# Altium footprint library 元件库PCB.PcbLib: 63 footprints (part 1 of 4)
Each footprint in its own frame and in the unit in brackets; x right, y up, seen from the top. Pads: shape width x height; smd on the part's side, far side on the other; paste and mask are expansions set on the pad; w line width, h text height; cw(c..) or ccw(c..) is an arc to the next point about the centre after c.
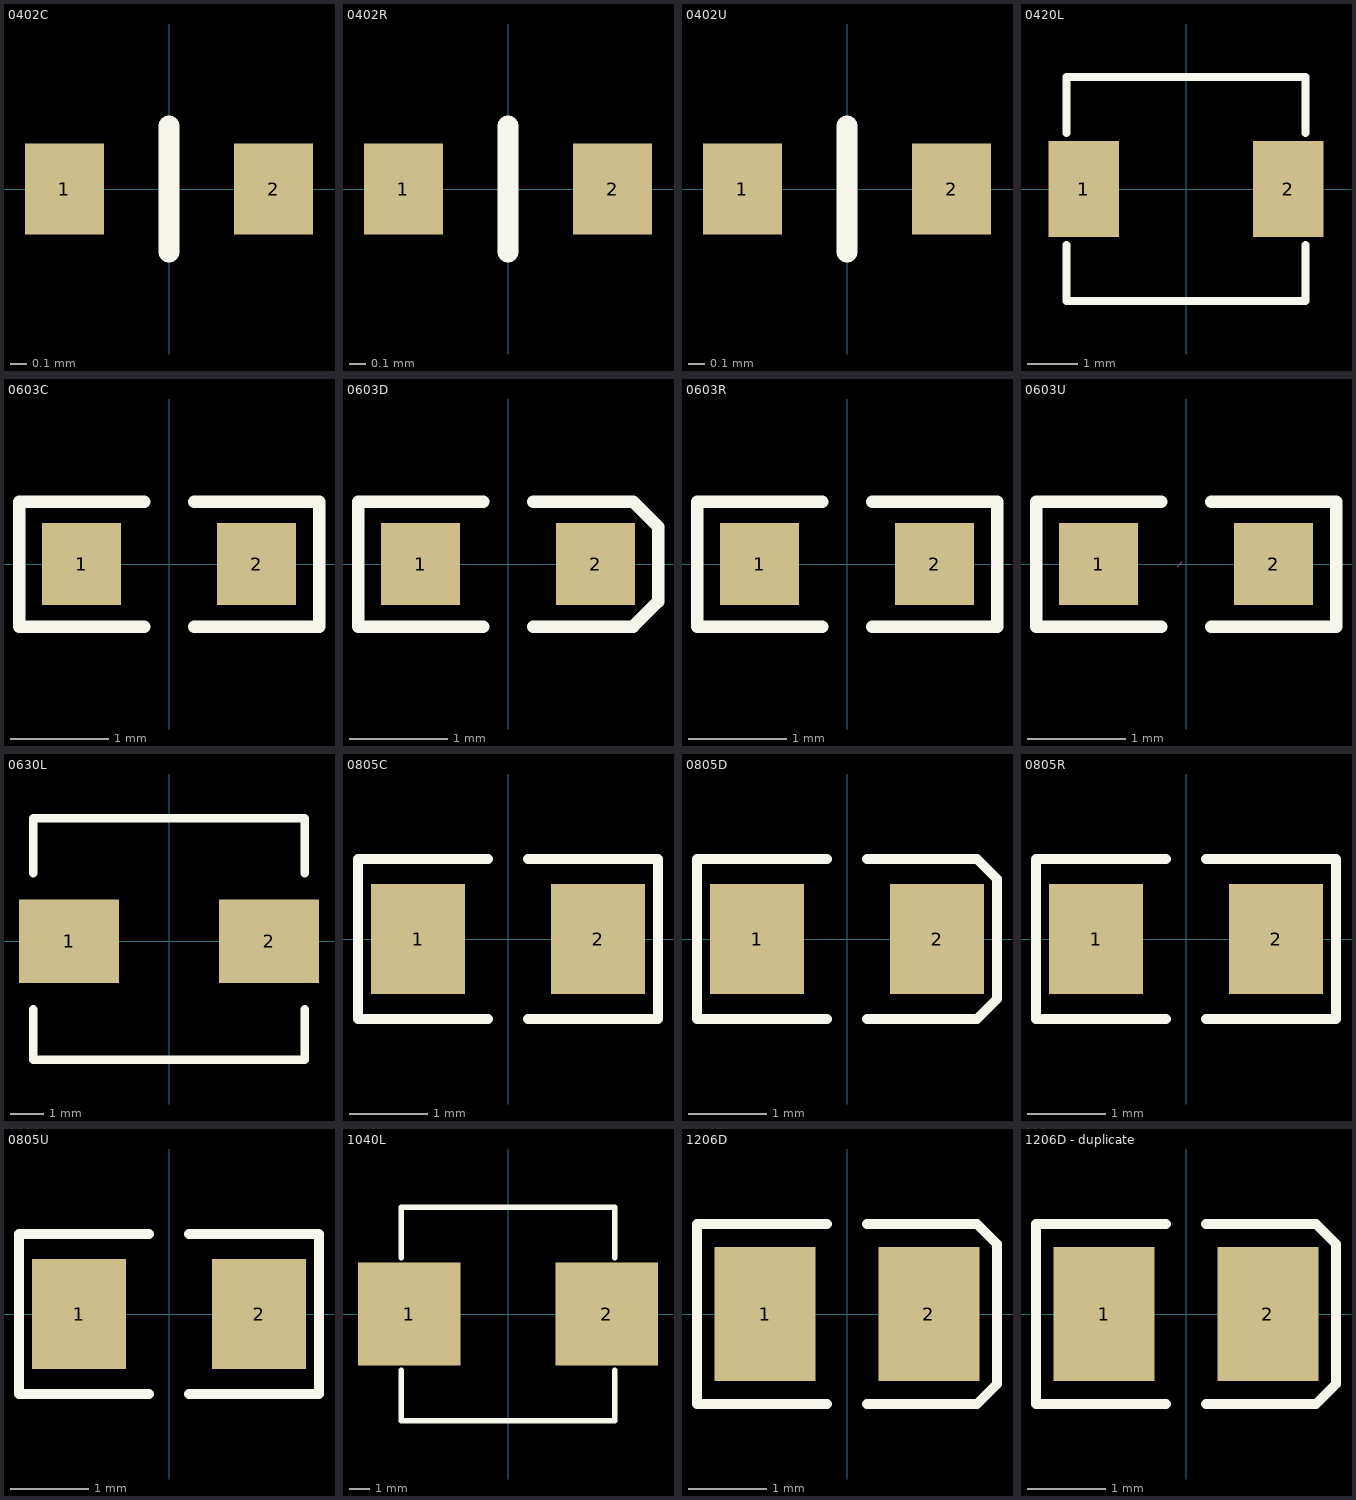
[diagram p0: the footprints below, top view; thin cyan lines are the x and y axes]

## 0402C [mm] "0402锟斤拷装锟斤拷锟斤拷锟斤拷锟斤拷"
pads (2):
  rect 0.48x0.55 smd: 1(-0.635,0) 2(0.635,0)
Top Overlay:
  lines w0.127: 0,-0.381 0,0 0,0.381
3D body "User Library-cap_0402.STEP": height 0.5, standoff 0, extent -0.5,-0.25 0.5,0.25

## 0402R [mm] "0402锟斤拷装锟斤拷锟斤拷锟斤拷锟斤拷"
pads (2):
  rect 0.48x0.55 smd: 1(-0.635,0) 2(0.635,0)
Top Overlay:
  lines w0.127: 0,-0.381 0,0 0,0.381
3D body "User Library-Res-0402.step": height 0.32, standoff 0, extent -0.5,-0.25 0.5,0.25

## 0402U [mm] "通锟斤拷0402锟斤拷装"
pads (2):
  rect 0.48x0.55 smd: 1(-0.635,0) 2(0.635,0)
Top Overlay:
  lines w0.127: 0,-0.381 0,0 0,0.381

## 0420L [mm]
pads (2):
  rect 1.4x1.9 smd: 1(-2.032,0) 2(2.032,0)
Top Overlay:
  lines w0.152: -2.376,-1.112 -2.376,-2.226 2.376,-2.226 2.376,-1.112 ; -2.376,1.112 -2.376,2.226 2.376,2.226 2.376,1.112
Mechanical 15:
  lines w0.003: -1.651,-0.127 -1.651,-0.127
3D body "WE_Inductor_4020.STEP": height 1.8, standoff 0, extent -2.32,-2.03 2.32,2.03

## 0603C [mm] "0603锟斤拷装锟斤拷锟斤拷锟斤拷锟斤拷"
pads (2):
  rect 0.8x0.83 smd: 1(-0.889,0) 2(0.889,0)
Top Overlay:
  lines w0.127: -0.254,-0.635 -1.524,-0.635 -1.524,0.635 -0.254,0.635 ; 0.254,-0.635 1.524,-0.635 1.524,0.635 0.254,0.635
3D body "User Library-c0603-3.STEP": height 0.81, standoff -0.01, extent -0.8,-0.41 0.8,0.41

## 0603D [mm] "0603锟斤拷装锟斤拷LED锟斤拷"
pads (2):
  rect 0.8x0.83 smd: 1(-0.889,0) 2(0.889,0)
Top Overlay:
  lines w0.127: -0.254,-0.635 -1.524,-0.635 -1.524,0.635 -0.254,0.635 ; 0.254,-0.635 1.27,-0.635 1.524,-0.381 1.524,0.381 1.27,0.635 0.254,0.635
3D body "ALSRobot-LED0603(G).step": height 0.6, standoff 0, extent -0.81,-0.4 0.81,0.4

## 0603R [mm] "0603锟斤拷装锟斤拷锟斤拷锟斤拷锟矫ｏ拷缺锟斤拷为锟斤拷锟斤拷锟斤拷锟斤拷/锟斤拷锟斤拷"
pads (2):
  rect 0.8x0.83 smd: 1(-0.889,0) 2(0.889,0)
Top Overlay:
  lines w0.127: -0.254,-0.635 -1.524,-0.635 -1.524,0.635 -0.254,0.635 ; 0.254,-0.635 1.524,-0.635 1.524,0.635 0.254,0.635
3D body "User Library-Res-0603.STEP": height 0.42, standoff 0, extent -0.8,-0.4 0.8,0.4

## 0603U [mm] "通锟斤拷0603锟斤拷装"
pads (2):
  rect 0.8x0.83 smd: 1(-0.889,0) 2(0.889,0)
Top Overlay:
  lines w0.127: -0.254,-0.635 -1.524,-0.635 -1.524,0.635 -0.254,0.635 ; 0.254,-0.635 1.524,-0.635 1.524,0.635 0.254,0.635
Mechanical 15:
  lines w0.003: -0.09,-0.025 -0.04,0.025

## 0630L [mm]
pads (2):
  rect 3x2.5 smd: 1(-3,0) 2(3,0)
Top Overlay:
  lines w0.254: -4.073,-2.041 -4.073,-3.556 4.073,-3.556 4.073,-2.041 ; -4.073,2.041 -4.073,3.683 4.073,3.683 4.073,2.041
3D body "�ޱ���.step": height 4, standoff 0, extent -4,-3.429 4,3.571

## 0805C [mm] "0805锟斤拷装锟斤拷锟斤拷锟斤拷锟斤拷"
pads (2):
  rect 1.2x1.4 smd: 1(-1.143,0) 2(1.143,0)
Top Overlay:
  lines w0.127: -0.254,-1.016 -1.905,-1.016 -1.905,1.016 -0.254,1.016 ; 0.254,-1.016 1.905,-1.016 1.905,1.016 0.254,1.016
3D body "User Library-c0805-3.STEP": height 1.28, standoff -0.01, extent -1,-0.645 1,0.645

## 0805D [mm] "0805锟斤拷装锟斤拷LED锟斤拷"
pads (2):
  rect 1.2x1.4 smd: 1(-1.143,0) 2(1.143,0)
Top Overlay:
  lines w0.127: -0.254,-1.016 -1.905,-1.016 -1.905,1.016 -0.254,1.016 ; 0.254,-1.016 1.651,-1.016 1.905,-0.762 1.905,0.762 1.651,1.016 0.254,1.016
3D body "ALSRobot-LED0805(R).step": height 1.1, standoff 0, extent -1.01,-0.625 1.01,0.625

## 0805R [mm] "0805锟斤拷装锟斤拷锟斤拷锟斤拷锟斤拷"
pads (2):
  rect 1.2x1.4 smd: 1(-1.143,0) 2(1.143,0)
Top Overlay:
  lines w0.127: -0.254,-1.016 -1.905,-1.016 -1.905,1.016 -0.254,1.016 ; 0.254,-1.016 1.905,-1.016 1.905,1.016 0.254,1.016
3D body "0805.step": height 0.53, standoff 0, extent -1,-0.625 1,0.625

## 0805U [mm] "通锟斤拷0805锟斤拷装"
pads (2):
  rect 1.2x1.4 smd: 1(-1.143,0) 2(1.143,0)
Top Overlay:
  lines w0.127: -0.254,-1.016 -1.905,-1.016 -1.905,1.016 -0.254,1.016 ; 0.254,-1.016 1.905,-1.016 1.905,1.016 0.254,1.016

## 1040L [mm]
pads (2):
  rect 5x5 smd: 1(-4.8,0) 2(4.8,0)
Top Overlay:
  lines w0.254: -5.199,-2.731 -5.199,-5.199 5.199,-5.199 5.199,-2.731 ; -5.199,2.731 -5.199,5.199 5.199,5.199 5.199,2.731
3D body "10x10mm.step": height 3.87, standoff -0.03, extent -5.416,-5.015 5.344,4.985

## 1206D [mm] "1206锟斤拷装锟斤拷LED锟斤拷"
pads (2):
  rect 1.28x1.7 smd: 1(-1.04,0) 2(1.04,0)
Top Overlay:
  lines w0.127: -0.254,-1.143 -1.905,-1.143 -1.905,1.143 -0.254,1.143 ; 0.254,-1.143 1.651,-1.143 1.905,-0.889 1.905,0.889 1.651,1.143 0.254,1.143

## 1206D - duplicate [mm] "1206锟斤拷装锟斤拷LED锟斤拷"
pads (2):
  rect 1.28x1.7 smd: 1(-1.04,0) 2(1.04,0)
Top Overlay:
  lines w0.127: -0.254,-1.143 -1.905,-1.143 -1.905,1.143 -0.254,1.143 ; 0.254,-1.143 1.651,-1.143 1.905,-0.889 1.905,0.889 1.651,1.143 0.254,1.143